# Altium footprint library agh_racing_2018.PcbLib: 166 footprints (part 8 of 11)
Each footprint in its own frame and in the unit in brackets; x right, y up, seen from the top. Pads: shape width x height; smd on the part's side, far side on the other; paste and mask are expansions set on the pad; w line width, h text height; cw(c..) or ccw(c..) is an arc to the next point about the centre after c.
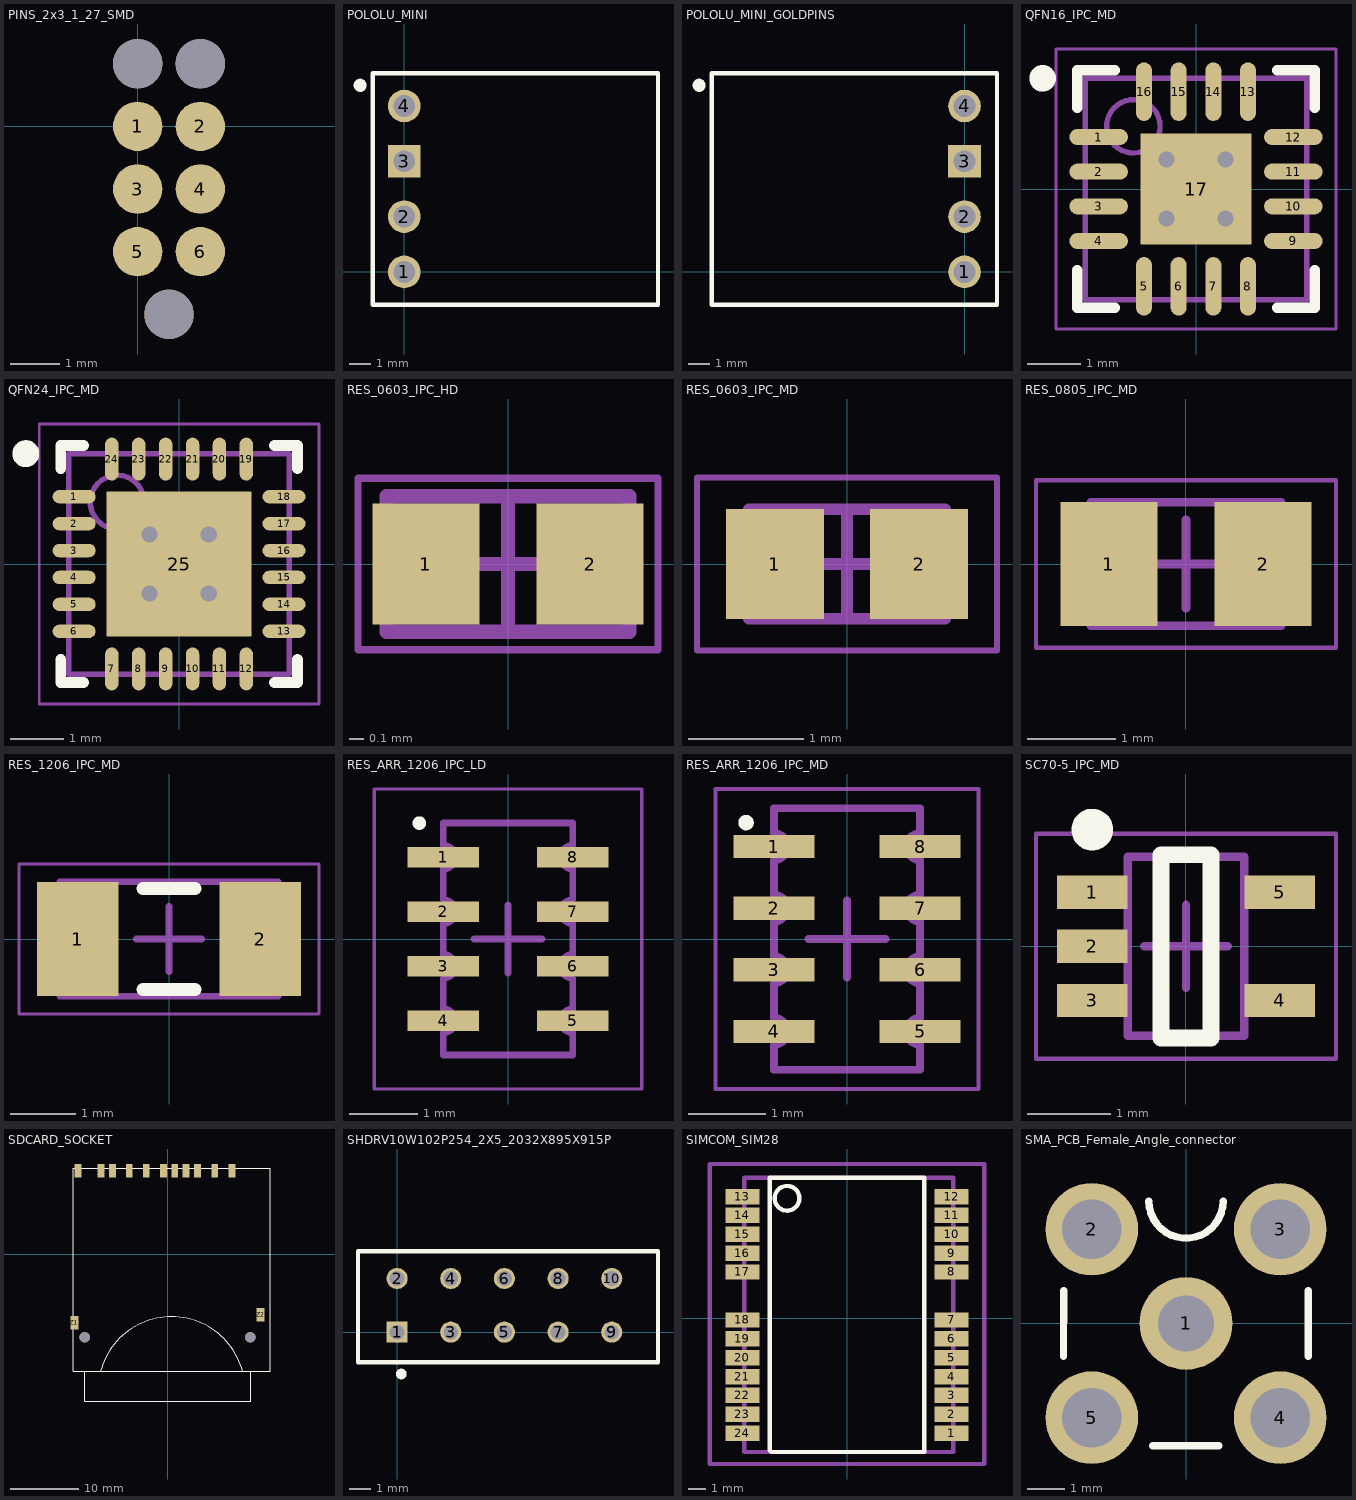
[diagram p7: the footprints below, top view; thin cyan lines are the x and y axes]

## PINS_2x3_1_27_SMD [mm]
pads (9):
  round 1 smd mask+0.025: 1(0,0) 2(1.27,0) 3(0,-1.27) 4(1.27,-1.27) 5(0,-2.54) 6(1.27,-2.54)
  round 1 hole 1 unplated mask+0.025: ""(0,1.27) ""(0.635,-3.81) ""(1.27,1.27)

## POLOLU_MINI [mm]
height 2.8
pads (4):
  round 1.5 hole 1: 1(0,0) 2(0,2.54) 4(0,7.62)
  rect 1.5x1.5 hole 1: 3(0,5.08)
Top Overlay:
  circle w0.4: c-2.025,8.57 r0.1
  lines w0.2: -1.45,-1.505 11.65,-1.505 11.65,9.12 -1.45,9.12 -1.45,-1.505
3D body "Pololu 2843 5V Step Down Regulator.STEP": height 2.79, standoff 0, extent -1.313,-1.384 11.514,9.004

## POLOLU_MINI_GOLDPINS [mm]
height 5.4
pads (4):
  round 1.5 hole 1: 1(0,0) 2(0,2.54) 4(0,7.62)
  rect 1.5x1.5 hole 1: 3(0,5.08)
Top Overlay:
  circle w0.4: c-12.185,8.57 r0.1
  lines w0.2: -11.61,-1.505 1.49,-1.505 1.49,9.12 -11.61,9.12 -11.61,-1.505
3D body "PololuWithGoldpins.STEP": height 5.69, standoff -5.85, extent -11.493,-1.372 1.333,9.017

## QFN16_IPC_MD [mm] "QFN, 16-Leads, Body 4.00x4.00mm, Pitch 0.65mm, Thermal Pad 2.08x2.08mm, IPC Medium Density"
height 0.8
pads (17):
  oval 1.1x0.3 smd: 1(-1.825,0.975) 2(-1.825,0.325) 3(-1.825,-0.325) 4(-1.825,-0.975) 9(1.825,-0.975) 10(1.825,-0.325) 11(1.825,0.325) 12(1.825,0.975)
  oval 0.3x1.1 smd: 5(-0.975,-1.825) 6(-0.325,-1.825) 7(0.325,-1.825) 8(0.975,-1.825) 13(0.975,1.825) 14(0.325,1.825) 15(-0.325,1.825) 16(-0.975,1.825)
  rect 2.08x2.08 smd: 17(0,0)
via 0.55,-0.55 diameter 0.711 hole 0.3
via -0.55,-0.55 diameter 0.711 hole 0.3
via 0.55,0.55 diameter 0.711 hole 0.3
via -0.55,0.55 diameter 0.711 hole 0.3
Top Overlay:
  circle w0.25: c-2.875,2.075 r0.125
  lines w0.2: -2.225,-1.525 -2.225,-2.225 -1.525,-2.225 ; -2.225,1.525 -2.225,2.225 -1.525,2.225 ; 1.525,-2.225 2.225,-2.225 2.225,-1.525 ; 1.525,2.225 2.225,2.225 2.225,1.525
Mechanical 13:
  circle w0.1: c-1.175,1.175 r0.5
  lines w0.1: -2.075,-2.075 2.075,-2.075 2.075,2.075 -2.075,2.075 -2.075,-2.075
Mechanical 15:
  lines w0.05: -2.625,-2.625 2.625,-2.625 2.625,2.625 -2.625,2.625 -2.625,-2.625
  lines w0.1: -0.5,0 0.5,0 ; 0,-0.5 0,0.5
3D body "QFN16_IPC_MD.step": height 0.8, standoff 0, extent -2.085,-2.085 2.085,2.085

## QFN24_IPC_MD [mm] "QFN, 24-Leads, Body 4,00x4,00mm, Pitch 0,50mm, Thermal Pad 2,70x2,70mm, IPC Medium Density"
height 0.95
pads (25):
  oval 0.8x0.25 smd: 1(-1.95,1.25) 2(-1.95,0.75) 3(-1.95,0.25) 4(-1.95,-0.25) 5(-1.95,-0.75) 6(-1.95,-1.25) 13(1.95,-1.25) 14(1.95,-0.75) 15(1.95,-0.25) 16(1.95,0.25) 17(1.95,0.75) 18(1.95,1.25)
  oval 0.25x0.8 smd: 7(-1.25,-1.95) 8(-0.75,-1.95) 9(-0.25,-1.95) 10(0.25,-1.95) 11(0.75,-1.95) 12(1.25,-1.95) 19(1.25,1.95) 20(0.75,1.95) 21(0.25,1.95) 22(-0.25,1.95) 23(-0.75,1.95) 24(-1.25,1.95)
  rect 2.7x2.7 smd: 25(0,0)
via -0.55,0.55 diameter 0.711 hole 0.3
via 0.55,0.55 diameter 0.711 hole 0.3
via 0.55,-0.55 diameter 0.711 hole 0.3
via -0.55,-0.55 diameter 0.711 hole 0.3
Top Overlay:
  circle w0.25: c-2.85,2.05 r0.125
  lines w0.2: -2.2,-1.775 -2.2,-2.2 -1.775,-2.2 ; -2.2,1.775 -2.2,2.2 -1.775,2.2 ; 1.775,-2.2 2.2,-2.2 2.2,-1.775 ; 1.775,2.2 2.2,2.2 2.2,1.775
Mechanical 13:
  circle w0.1: c-1.15,1.15 r0.5
  lines w0.1: -2.05,-2.05 -2.05,2.05 2.05,2.05 2.05,-2.05 -2.05,-2.05
Mechanical 15:
  lines w0.05: -2.6,-2.6 -2.6,2.6 2.6,2.6 2.6,-2.6 -2.6,-2.6
  lines w0.1: -0.5,0 0.5,0 ; 0,-0.5 0,0.5
3D body "QFN24_IPC_MD.step": height 0.95, standoff 0, extent -2.051,-2.051 2.051,2.051

## RES_0603_IPC_HD [mm] "Chip Resistor, 2-Leads, Body 1,55x0,80mm, IPC High Density"
height 0.55
pads (2):
  rect 0.75x0.85 smd: 1(-0.575,0) 2(0.575,0)
Mechanical 13:
  lines w0.1: -0.85,-0.475 -0.85,0.475 0.85,0.475 0.85,-0.475 -0.85,-0.475
Mechanical 15:
  lines w0.05: -1.05,-0.6 -1.05,0.6 1.05,0.6 1.05,-0.6 -1.05,-0.6
  lines w0.1: -0.475,0 0.475,0 ; 0,-0.475 0,0.475
3D body "RES_0603_HD.step": height 0.55, standoff 0, extent -0.85,-0.475 0.85,0.475

## RES_0603_IPC_MD [mm] "Chip Resistor, 2-Leads, Body 1,55x0,80mm, IPC Medium Density"
height 0.55
pads (2):
  rect 0.85x0.95 smd: 1(-0.625,0) 2(0.625,0)
Mechanical 13:
  lines w0.1: -0.85,-0.475 0.85,-0.475 0.85,0.475 -0.85,0.475 -0.85,-0.475
Mechanical 15:
  lines w0.05: -1.3,-0.75 1.3,-0.75 1.3,0.75 -1.3,0.75 -1.3,-0.75
  lines w0.1: -0.475,0 0.475,0 ; 0,-0.475 0,0.475
3D body "RES_0603_IPC_MD.step": height 0.55, standoff 0, extent -0.85,-0.475 0.85,0.475

## RES_0805_IPC_MD [mm] "Chip Resistor, 2-Leads, 0805, Royal Ohm, IPC Medium Density"
height 0.65
pads (2):
  rect 1.1x1.4 smd: 1(-0.875,0) 2(0.875,0)
Mechanical 13:
  lines w0.1: -1.075,-0.7 -1.075,0.7 1.075,0.7 1.075,-0.7 -1.075,-0.7
Mechanical 15:
  lines w0.05: -1.7,-0.95 1.7,-0.95 1.7,0.95 -1.7,0.95 -1.7,-0.95
  lines w0.1: -0.5,0 0.5,0 ; 0,-0.5 0,0.5
3D body "RES_0805_IPC_MD.step": height 0.65, standoff 0, extent -1.075,-0.7 1.075,0.7

## RES_1206_IPC_MD [mm] "Chip Resistor, 2-Leads, 1206, IPC Medium Density"
height 0.71
pads (2):
  rect 1.25x1.75 smd: 1(-1.4,0) 2(1.4,0)
Top Overlay:
  lines w0.2: -0.4,-0.775 0.4,-0.775 ; -0.4,0.775 0.4,0.775
Mechanical 13:
  lines w0.1: -1.675,-0.875 1.675,-0.875 1.675,0.875 -1.675,0.875 -1.675,-0.875
Mechanical 15:
  lines w0.05: -2.3,-1.15 2.3,-1.15 2.3,1.15 -2.3,1.15 -2.3,-1.15
  lines w0.1: -0.5,0 0.5,0 ; 0,-0.5 0,0.5
3D body "RES_1206_IPC_MD.step": height 0.71, standoff 0, extent -1.675,-0.875 1.675,0.875

## RES_ARR_1206_IPC_LD [mm] "Chip Array, Concave, 8-Leads, Pitch 0,80mm,  Body 3,20x1,60mm,  IPC Low Density"
height 0.6
pads (8):
  rect 1.05x0.3 smd: 1(-0.95,1.2) 2(-0.95,0.4) 3(-0.95,-0.4) 4(-0.95,-1.2) 5(0.95,-1.2) 6(0.95,-0.4) 7(0.95,0.4) 8(0.95,1.2)
Top Overlay:
  circle w0.1: c-1.3,1.7 r0.05
Assembly Top:
  lines w0.1: -0.95,-1.7 0.95,-1.7 0.95,-1.375 cw(c0.95,-1.2) 0.95,-1.025 0.95,-0.575 cw(c0.95,-0.4) 0.95,-0.225 0.95,0.225 cw(c0.95,0.4) 0.95,0.575 0.95,1.025 cw(c0.95,1.2) 0.95,1.375 0.95,1.7 -0.95,1.7 -0.95,1.375 cw(c-0.95,1.2) -0.95,1.025 -0.95,0.575 cw(c-0.95,0.4) -0.95,0.225 -0.95,-0.225 cw(c-0.95,-0.4) -0.95,-0.575 -0.95,-1.025 cw(c-0.95,-1.2) -0.95,-1.375 -0.95,-1.7
Courtyard Top:
  lines w0.05: -1.96,-2.2 1.96,-2.2 1.96,2.2 -1.96,2.2 -1.96,-2.2
  lines w0.1: -0.5,0 0.5,0 ; 0,-0.5 0,0.5
3D body "CAC-80P320X160-8M.step": height 0.6, standoff 0, extent -0.95,-1.7 0.95,1.7

## RES_ARR_1206_IPC_MD [mm] "Chip Array, Concave, 8-Leads, Pitch 0,80mm,  Body 3,20x1,60mm,  IPC Medium Density"
height 0.6
pads (8):
  rect 1.05x0.3 smd: 1(-0.95,1.2) 2(-0.95,0.4) 3(-0.95,-0.4) 4(-0.95,-1.2) 5(0.95,-1.2) 6(0.95,-0.4) 7(0.95,0.4) 8(0.95,1.2)
Top Overlay:
  circle w0.1: c-1.312,1.513 r0.05
Assembly Top:
  lines w0.1: -0.95,-1.7 -0.95,-1.375 ccw(c-0.95,-1.2) -0.95,-1.025 -0.95,-0.575 ccw(c-0.95,-0.4) -0.95,-0.225 -0.95,0.225 ccw(c-0.95,0.4) -0.95,0.575 -0.95,1.025 ccw(c-0.95,1.2) -0.95,1.375 -0.95,1.7 0.95,1.7 0.95,1.375 ccw(c0.95,1.2) 0.95,1.025 0.95,0.575 ccw(c0.95,0.4) 0.95,0.225 0.95,-0.225 ccw(c0.95,-0.4) 0.95,-0.575 0.95,-1.025 ccw(c0.95,-1.2) 0.95,-1.375 0.95,-1.7 -0.95,-1.7
Courtyard Top:
  lines w0.05: -1.71,-1.95 -1.71,1.95 1.71,1.95 1.71,-1.95 -1.71,-1.95
  lines w0.1: -0.5,0 0.5,0 ; 0,-0.5 0,0.5
3D body "CAC-80P320X160-8N_MD.step": height 0.6, standoff 0, extent -0.95,-1.7 0.95,1.7

## SC70-5_IPC_MD [mm] "SOT23, 5-Leads, Body 1,30x2,10mm, Pitch 0,65mm, IPC Medium Density"
height 1.1
pads (5):
  rect 0.85x0.4 smd: 1(-1.125,0.65) 2(-1.125,0) 3(-1.125,-0.65) 4(1.125,-0.65) 5(1.125,0.65)
Top Overlay:
  circle w0.25: c-1.125,1.4 r0.125
  lines w0.2: -0.3,-1.1 0.3,-1.1 0.3,1.1 -0.3,1.1 -0.3,-1.1
Mechanical 13:
  lines w0.1: -0.7,-1.075 -0.7,1.075 0.7,1.075 0.7,-1.075 -0.7,-1.075
Mechanical 15:
  lines w0.05: -1.8,-1.35 -1.8,1.35 1.8,1.35 1.8,-1.35 -1.8,-1.35
  lines w0.1: -0.5,0 0.5,0 ; 0,-0.5 0,0.5
3D body "SC70-5_IPC_MD.step": height 1.1, standoff 0, extent -1.2,-1.075 1.2,1.075

## SDCARD_SOCKET [mm] "WR-CRD SD_Push and Push_with card detection_9 pins"
height 2.85
pads (15):
  rect 1x2 smd: 1(6.9,12.155) 2(4.4,12.155) 3(1.05,12.155) 4(-0.6,12.155) 5(-3.1,12.155) 6(-5.6,12.155) 7(-8.02,12.155) 8(-9.72,12.155) 9(9.4,12.155) CD(2.7,12.155) WP(-13.07,12.155)
  rect 1.2x2 smd: Z1(-13.6,-10.055) Z2(13.6,-8.855)
  round 1.5 hole 1.5 unplated: ""(-12.1,-12.155) ""(12.1,-12.155)
Top Overlay:
  lines w0.127: -12.1,-17.155 -12.1,-21.5 12.15,-21.5 12.15,-17.155 ; -9.8,-17.155 cw(c0.6,-19.915) 11,-17.155 ; -13.77,-17.155 15.03,-17.155 15.03,12.545 -13.77,12.545 -13.77,-17.155
3D body "693061010911.stp": height 3.06, standoff -0.49, extent -13.8,-17.16 15,12.74

## SHDRV10W102P254_2X5_2032X895X915P [mm]
height 9.15
pads (10):
  rect 1x1 hole 0.7: 1(0,0)
  round 1 hole 0.7: 2(0,2.54) 3(2.54,0) 4(2.54,2.54) 5(5.08,0) 6(5.08,2.54) 7(7.62,0) 8(7.62,2.54) 9(10.16,0) 10(10.16,2.54)
Top Overlay:
  circle w0.25: c0.2,-1.98 r0.125
  lines w0.2: -1.85,-1.425 12.35,-1.425 12.35,3.825 -1.85,3.825 -1.85,-1.425
Mechanical 20:
  circle w0.05: c0,0 r0.35
  lines w0.05: -0.5,0 0.5,0 ; 0,-0.5 0,0.5
3D body: height 6.5, standoff -2.5, extent 9.91,2.29 10.41,2.79
3D body: height 6.5, standoff -2.5, extent 7.37,2.29 7.87,2.79
3D body: height 6.5, standoff -2.5, extent 4.83,2.29 5.33,2.79
3D body: height 6.5, standoff -2.5, extent 2.29,2.29 2.79,2.79
3D body: height 6.5, standoff -2.5, extent -0.25,2.29 0.25,2.79
3D body: height 9, standoff -2.5, extent 9.91,-0.25 10.41,0.25
3D body: height 9, standoff -2.5, extent 7.37,-0.25 7.87,0.25
3D body: height 9, standoff -2.5, extent 4.83,-0.25 5.33,0.25
3D body: height 9, standoff -2.5, extent 2.29,-0.25 2.79,0.25
3D body: height 9, standoff -2.5, extent -0.25,-0.25 0.25,0.25
3D body: height 3, standoff 2.6, extent -1.125,-1.375 -1.125,-1.375
3D body: height 3, standoff 2.6, extent -1.875,-1.425 -1.875,-1.425
3D body: height 6.5, standoff 6, extent -0.25,2.29 0.25,4.29
3D body: height 6.5, standoff 6, extent 2.29,2.29 2.79,4.29
3D body: height 6.5, standoff 6, extent 4.83,2.29 5.33,4.29
3D body: height 6.5, standoff 6, extent 7.37,2.29 7.87,4.29
3D body: height 6.5, standoff 6, extent 9.91,2.29 10.41,4.29
3D body: height 9, standoff 8.5, extent -0.25,-0.25 0.25,4.29
3D body: height 9, standoff 8.5, extent 2.29,-0.25 2.79,4.29
3D body: height 9, standoff 8.5, extent 4.83,-0.25 5.33,4.29
3D body: height 9, standoff 8.5, extent 7.37,-0.25 7.87,4.29
3D body: height 9, standoff 8.5, extent 9.91,-0.25 10.41,4.29
3D body: height 12.1, standoff 3.15, extent -5,4.275 15.15,13.3
3D body: height 9.31, standoff -0.41, extent -4.1,4.025 -4.1,4.025

## SIMCOM_SIM28 [mm] "Modu³: GPS; GPIO, I2C, SPI, UART"
height 3
pads (24):
  rect 2x0.9 smd: 1(6.1,-6.7) 2(6.1,-5.6) 3(6.1,-4.5) 4(6.1,-3.4) 5(6.1,-2.3) 6(6.1,-1.2) 7(6.1,-0.1) 8(6.1,2.7) 9(6.1,3.8) 10(6.1,4.9) 11(6.1,6) 12(6.1,7.1) 13(-6.1,7.1) 14(-6.1,6) 15(-6.1,4.9) 16(-6.1,3.8) 17(-6.1,2.7) 18(-6.1,-0.1) 19(-6.1,-1.2) 20(-6.1,-2.3) 21(-6.1,-3.4) 22(-6.1,-4.5) 23(-6.1,-5.6) 24(-6.1,-6.7)
Top Overlay:
  circle w0.254: c-3.5,7 r0.721
  lines w0.254: -4.5,-7.7 -4.4,-7.8 4.5,-7.8 4.5,8.2 -4.5,8.2 -4.5,-7.7
Mechanical 13:
  lines w0.254: -6,-7.8 -6,8.2 6.2,8.2 6.2,-7.8 -6,-7.8
Mechanical 15:
  lines w0.254: -8,-8.5 8,-8.5 8,9 -8,9 -8,-8.5
3D body: height 2.4, standoff 0.8, extent -6,-7.8 6.2,8.2

## SMA_PCB_Female_Angle_connector [mm]
pads (5):
  round 2.5 hole 1.5: 1(0,0)
  round 2.5 hole 1.6: 2(-2.54,2.54) 3(2.54,2.54) 4(2.54,-2.54) 5(-2.54,-2.54)
Top Overlay:
  lines w0.2: -3.304,-0.889 -3.302,0.889 ; -1,3.3 ccw(c0,3.3) 1,3.3 ; -0.903,-3.302 0.889,-3.302 ; 3.299,-0.889 3.301,0.889
3D body "c-5-1814400-1-d-3d.stp": height 10.48, standoff -3.05, extent -3.163,-3.2 3.163,11